# Altium footprint library my Library.PcbLib: 1247 footprints (part 52 of 78)
Each footprint in its own frame and in the unit in brackets; x right, y up, seen from the top. Pads: shape width x height; smd on the part's side, far side on the other; paste and mask are expansions set on the pad; w line width, h text height; cw(c..) or ccw(c..) is an arc to the next point about the centre after c.
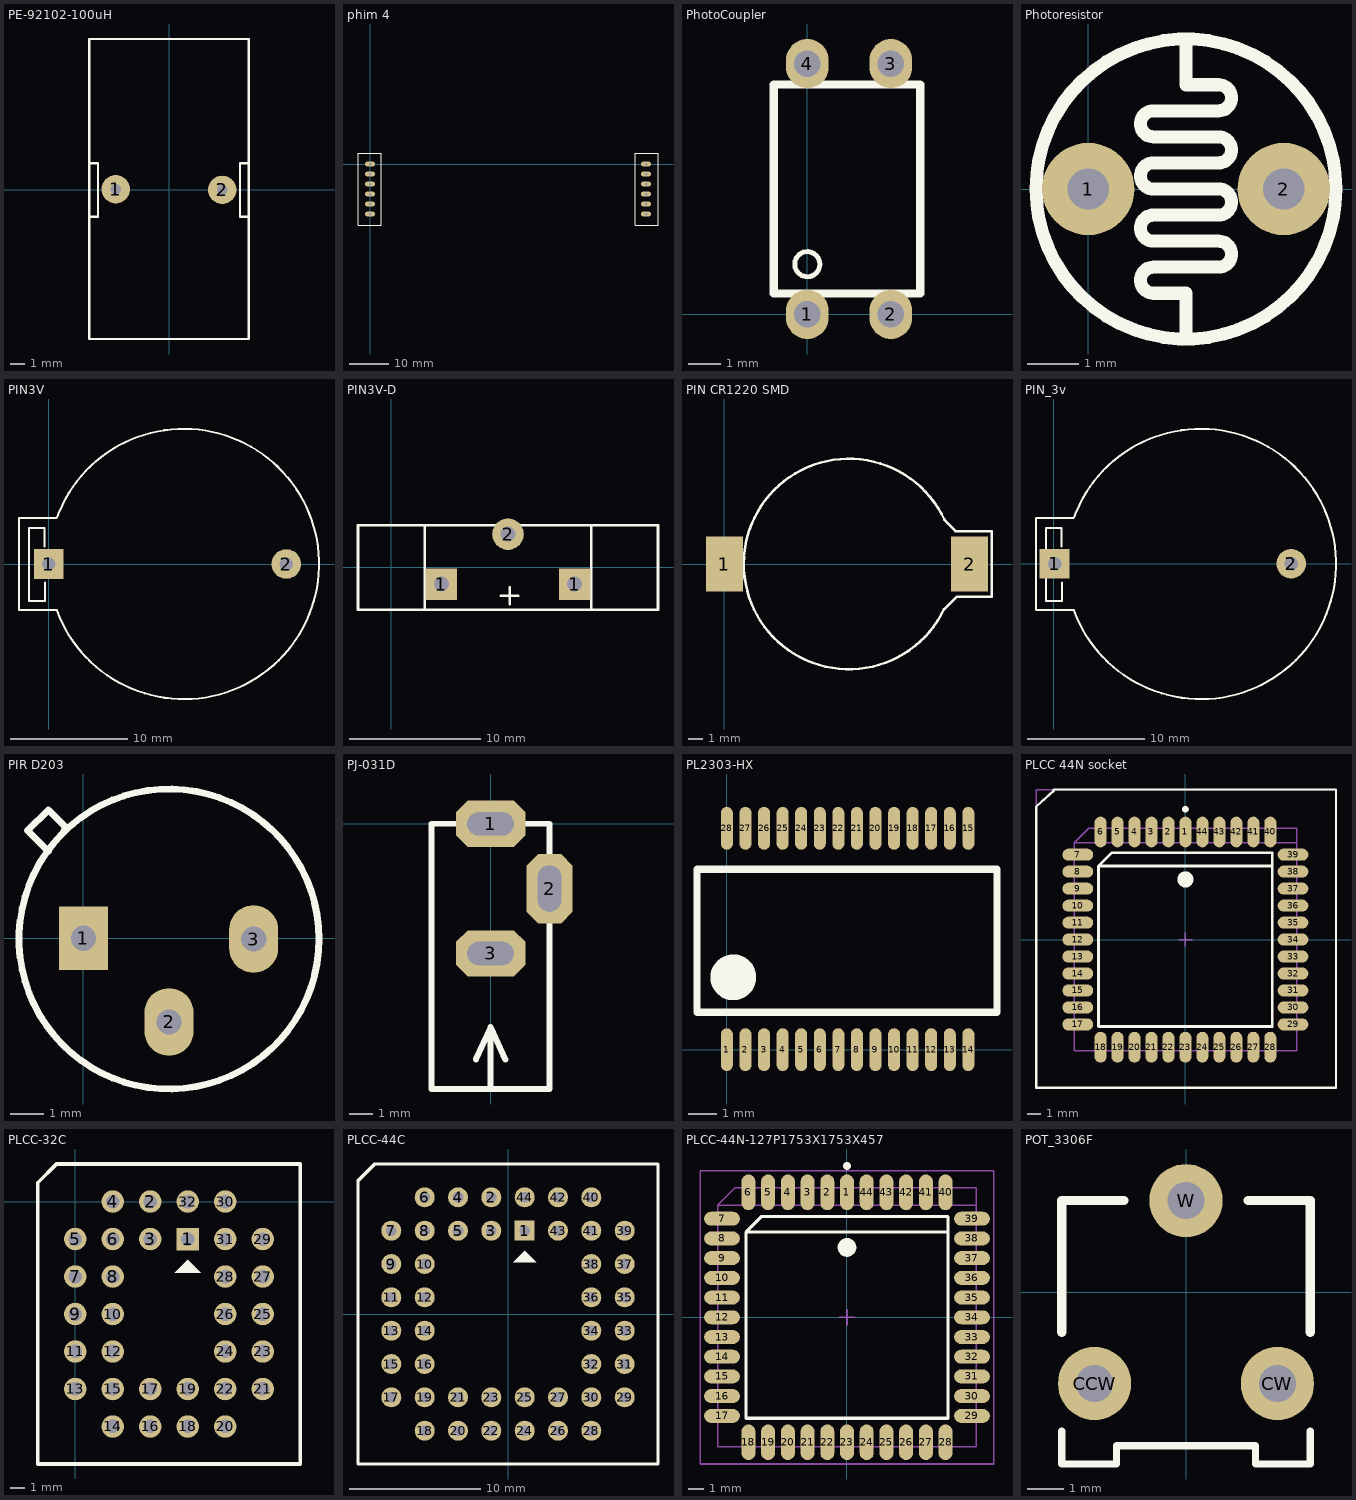
[diagram p51: the footprints below, top view; thin cyan lines are the x and y axes]

## PE-92102-100uH [mil]
pads (2):
  round 80 hole 30: 1(-150,2) 2(150,0)
Top Overlay:
  lines w7: -225,-75 -200,-75 -200,75 -225,75 ; 225,-75 200,-75 200,75 225,75 ; -225,-420 225,-420 225,425 -225,425 -225,-420
3D body "User Library-PE-92102KNL.STEP": height 948.95, standoff -84.84, extent -225,-422.99 225,427

## phim 4 [mil]
pads (12):
  oval 100x50 hole 25: 1(0,0) 2(0,-100) 3(0,-200) 4(0,-300) 5(0,-400) 6(0,-500) 7(2760,-500) 8(2760,-400) 9(2760,-300) 10(2760,-200) 11(2760,-100) 12(2760,0)
Top Overlay:
  lines w10: -120,-610 110,-610 110,110 -120,110 -120,-610 ; 2650,-610 2880,-610 2880,110 2650,110 2650,-610
3D body "User Library-Button-BIG-4.step": height 688.98, standoff 177.17, extent 2137.56,-538.09 2610,8.09
3D body "User Library-Button-BIG-4.step": height 688.98, standoff 177.17, extent 1499.23,-538.09 1971.67,8.09
3D body "User Library-Button-BIG-4.step": height 688.98, standoff 177.17, extent 860.89,-538.09 1333.33,8.09
3D body "User Library-Button-BIG-4.step": height 688.98, standoff 177.17, extent 222.56,-538.09 695,8.09
3D body "female_header_a-bl254-eg-g06d.stp": height 440.94, standoff -19.69, extent 2711.79,-561 2810.21,48.84
3D body "female_header_a-bl254-eg-g06d.stp": height 440.94, standoff -19.69, extent -50,-555.92 48.43,53.92

## PhotoCoupler [mm] "Opto quang"
pads (4):
  oval 1.3x1.5 hole 0.8: 1(0,0) 2(2.54,0) 3(2.54,7.62) 4(0,7.62)
Top Overlay:
  circle w0.15: c0,1.524 r0.381
  lines w0.254: -1.016,0.635 3.429,0.635 3.429,6.985 -1.016,6.985 -1.016,0.635
3D body "SW3DPS-DIP4-DEFAULT.step": height 4.31, standoff -3.28, extent -1.532,-0.19 4.008,7.81

## Photoresistor [mm]
pads (2):
  round 1.8 hole 0.8: 1(0,0) 2(3.81,0)
Top Overlay:
  circle w0.254: c1.905,0 r2.924
  lines w0.254: 1.905,-2.921 1.905,-2.032 1.27,-2.032 cw(c1.27,-1.778) 1.27,-1.524 2.54,-1.524 ccw(c2.54,-1.27) 2.54,-1.016 1.27,-1.016 cw(c1.27,-0.762) 1.27,-0.508 2.54,-0.508 ccw(c2.54,-0.254) 2.54,0 1.27,0 cw(c1.27,0.254) 1.27,0.508 2.54,0.508 ccw(c2.54,0.762) 2.54,1.016 1.27,1.016 cw(c1.27,1.27) 1.27,1.524 2.54,1.524 ccw(c2.54,1.778) 2.54,2.032 1.905,2.032 1.905,2.921

## PIN3V [mil] "Socket PIN 3V"
pads (2):
  rect 100x100 hole 45: 1(0,0)
  round 100 hole 45: 2(800,0)
Top Overlay:
  lines w7: -14,59 -14,121 -66,121 -66,-124 -13,-124 -13,-63 ; 26.33,155 -100,155 -100,-155 27.93,-155 ; 27.6,156.07 cw(c455,0) 27.93,-156.97
3D body "batter2.STEP": height 278.16, standoff -137.2, extent -128.09,-446.83 1001.83,448.83

## PIN3V-D [mil] "Socket PIN 3V-Dung"
pads (3):
  rect 95x95 hole 45: 1(150,-50) 1(550,-50)
  round 95 hole 45: 2(350,100)
Top Overlay:
  lines w8: 100,-127 100,127 ; 329,-85 380,-85 ; 355,-110 355,-60 ; 600,-127 600,127 ; -100,-127 800,-127 800,127 -100,127 -100,-127

## PIN CR1220 SMD [mm] "Socket PIN 3V"
pads (2):
  rect 2.54x3.81 smd: 1(0,0) 2(17,0)
Top Overlay:
  lines w0.178: 15.23,-3.134 cw(c8.636,0) 15.265,3.059 ; 15.24,-3.15 16.104,-2.286 18.542,-2.286 18.542,2.286 16.027,2.286 15.24,3.073
3D body "User Library-Battery Holder for CR1220 SMD.STEP": height 4.03, standoff -0.72, extent -0.764,-7.383 18.036,7.366

## PIN_3v [mil]
pads (2):
  rect 100x100 hole 45: 1(3.54,0)
  round 100 hole 45: 2(800,0)
Top Overlay:
  lines w7: 26.94,57.82 26.94,119.82 -25.06,119.82 -25.06,-125.18 27.94,-125.18 27.94,-64.18 ; 67.27,153.82 -59.06,153.82 -59.06,-156.18 68.88,-156.18 ; 68.55,154.89 cw(c495.94,-1.18) 68.88,-158.15
3D body "User Library-CR2032_HOR_HOLD.STEP": height 335.24, standoff -156.88, extent -35.83,-433.86 928.74,432.28

## PIR D203 [mil]
pads (3):
  rect 58x75 hole 30: 1(0,0)
  oval 58x80 hole 30: 2(101,-99) 3(201,-1)
Top Overlay:
  circle w8: c101,-1 r177.17
  lines w8: -41,103 -42,103 -66,127 -41.5,151.5 -20,130 -23,127
3D body: height 172, standoff 150, extent 52.58,-98.73 198.24,46.22
3D body: height 172, standoff 150, extent -8.94,-36.51 135.31,108.45
3D body: height 171, standoff 150, extent -41.12,-137.27 237.48,140.62
3D body: height 170, standoff 20, extent -60.37,-163.37 258.37,156
3D body: height 40, standoff 20, extent -70,101 -15,156
3D body: height 40, standoff 20, extent -78,-181 280.58,178.29
3D body: height 80, standoff -70, extent 189.05,-12.95 212.95,11
3D body: height 80, standoff -70, extent -11.95,-11.95 11.95,12
3D body: height 80, standoff -70, extent 89.05,-110.95 112.95,-87
3D body: height 20, standoff -40, extent 171.31,-29.74 231,30
3D body: height 20, standoff -40, extent -29.69,-28.74 30,31
3D body: height 20, standoff -40, extent 71.31,-127.74 131,-68

## PJ-031D [mm] "Power Header 1mm"
pads (3):
  oct 3x2 hole 1 slot 2 at 0 deg paste+1: 1(0,0) 3(0,-5.588)
  oct 2x3 hole 1 slot 2 at 90 deg paste+1: 2(2.54,-2.794)
Top Overlay:
  lines w0.254: -0.635,-10.16 0,-8.763 ; 0,-11.43 0,-8.763 ; 0.635,-10.16 0,-8.763 ; -2.54,-11.43 -2.54,0 2.54,0 2.54,-11.43 -2.54,-11.43
3D body "PJ-031D.stp": height 7.4, standoff -3.2, extent -2.5,-11.43 2.9,0.17

## PL2303-HX [mil]
pads (28):
  oval 16.53x59.03 smd mask+7.9: 1(0,0) 2(25.6,0) 3(51.18,0) 4(76.78,0) 5(102.37,0) 6(127.97,0) 7(153.57,0) 8(179.15,0) 9(204.75,0) 10(230.35,0) 11(255.93,0) 12(281.53,0) 13(307.12,0) 14(332.7,0) 15(332.7,305) 16(307.12,305) 17(281.53,305) 18(255.93,305) 19(230.35,305) 20(204.75,305) 21(179.15,305) 22(153.57,305) 23(127.97,305) 24(102.37,305) 25(76.78,305) 26(51.18,305) 27(25.6,305) 28(0,305)
Top Overlay:
  circle w39.37: c8.8,99.7 r11.88
  lines w10: -41.22,51.66 -41.22,248.53 372.21,248.53 372.21,51.66 -41.22,51.66
3D body "SOP65P770x200-28N.step": height 84.65, standoff 0, extent -37.01,0.01 369.69,305.35

## PLCC 44N socket [mm]
pads (44):
  oval 0.9x2.3 smd: 1(0,8.05) 2(-1.27,8.05) 3(-2.54,8.05) 4(-3.81,8.05) 5(-5.08,8.05) 6(-6.35,8.05) 18(-6.35,-8.05) 19(-5.08,-8.05) 20(-3.81,-8.05) 21(-2.54,-8.05) 22(-1.27,-8.05) 23(0,-8.05) 24(1.27,-8.05) 25(2.54,-8.05) 26(3.81,-8.05) 27(5.08,-8.05) 28(6.35,-8.05) 40(6.35,8.05) 41(5.08,8.05) 42(3.81,8.05) 43(2.54,8.05) 44(1.27,8.05)
  oval 2.3x0.9 smd: 7(-8.05,6.35) 8(-8.05,5.08) 9(-8.05,3.81) 10(-8.05,2.54) 11(-8.05,1.27) 12(-8.05,0) 13(-8.05,-1.27) 14(-8.05,-2.54) 15(-8.05,-3.81) 16(-8.05,-5.08) 17(-8.05,-6.35) 29(8.05,-6.35) 30(8.05,-5.08) 31(8.05,-3.81) 32(8.05,-2.54) 33(8.05,-1.27) 34(8.05,0) 35(8.05,1.27) 36(8.05,2.54) 37(8.05,3.81) 38(8.05,5.08) 39(8.05,6.35)
Top Overlay:
  circle w0.25: c0,9.75 r0.125
  circle w0.6: c0,4.5 r0.3
  lines w0.178: -11.175,-11.08 11.265,-11.08 11.265,11.225 -9.84,11.225 -9.84,11.15 -11.175,9.935 -11.175,-11.08
  lines w0.2: 6.5,5.5 -6.5,5.5 ; -6.5,5.5 -5.5,6.5 6.5,6.5 6.5,-6.5 -6.5,-6.5 -6.5,5.5
Mechanical 13:
  lines w0.1: 8.331,7.231 -8.331,7.231 ; -8.331,7.231 -8.331,-8.331 8.331,-8.331 8.331,8.331 -7.231,8.331 -8.331,7.231
Mechanical 15:
  lines w0.1: -0.5,0 0.5,0 ; 0,-0.5 0,0.5 ; -11.18,-11.14 -11.18,11.215 11.245,11.215 11.245,-11.14 -11.18,-11.14
3D body "21744.stp": height 4.62, standoff -1.03, extent -11.165,-11.185 11.255,11.235

## PLCC-32C [mil] "Socket PLCC32R"
height 200
pads (32):
  rect 60x60 hole 36: 1(300,-100)
  round 60 hole 36: 2(200,0) 3(200,-100) 4(100,0) 5(0,-100) 6(100,-100) 7(0,-200) 8(100,-200) 9(0,-300) 10(100,-300) 11(0,-400) 12(100,-400) 13(0,-500) 14(100,-600) 15(100,-500) 16(200,-600) 17(200,-500) 18(300,-600) 19(300,-500) 20(400,-600) 21(500,-500) 22(400,-500) 23(500,-400) 24(400,-400) 25(500,-300) 26(400,-300) 27(500,-200) 28(400,-200) 29(500,-100) 30(400,0) 31(400,-100) 32(300,0)
Top Overlay:
  region: 300,-155 265,-190 335,-190
  lines w10: -100,-700 600,-700 600,100 -50,100 -100,50 -100,-700

## PLCC-44C [mil] "QPC-44C"
height 200
pads (44):
  rect 60x60 hole 32: 1(50,250)
  round 60 hole 32: 2(-50,350) 3(-50,250) 4(-150,350) 5(-150,250) 6(-250,350) 7(-350,250) 8(-250,250) 9(-350,150) 10(-250,150) 11(-350,50) 12(-250,50) 13(-350,-50) 14(-250,-50) 15(-350,-150) 16(-250,-150) 17(-350,-250) 18(-250,-350) 19(-250,-250) 20(-150,-350) 21(-150,-250) 22(-50,-350) 23(-50,-250) 24(50,-350) 25(50,-250) 26(150,-350) 27(150,-250) 28(250,-350) 29(350,-250) 30(250,-250) 31(350,-150) 32(250,-150) 33(350,-50) 34(250,-50) 35(350,50) 36(250,50) 37(350,150) 38(250,150) 39(350,250) 40(250,350) 41(250,250) 42(150,350) 43(150,250) 44(50,350)
Top Overlay:
  region: 50,190 15,155 85,155
  lines w10: -450,-450 450,-450 450,450 -400,450 -450,400 -450,-450

## PLCC-44N-127P1753X1753X457 [mm] "PLCC, 44-Leads, Body 17.7x17.7mm (max), Pitch 1.270mm, IPC Medium Density"
height 4.57
pads (44):
  oval 0.9x2.3 smd: 1(0,8.05) 2(-1.27,8.05) 3(-2.54,8.05) 4(-3.81,8.05) 5(-5.08,8.05) 6(-6.35,8.05) 18(-6.35,-8.05) 19(-5.08,-8.05) 20(-3.81,-8.05) 21(-2.54,-8.05) 22(-1.27,-8.05) 23(0,-8.05) 24(1.27,-8.05) 25(2.54,-8.05) 26(3.81,-8.05) 27(5.08,-8.05) 28(6.35,-8.05) 40(6.35,8.05) 41(5.08,8.05) 42(3.81,8.05) 43(2.54,8.05) 44(1.27,8.05)
  oval 2.3x0.9 smd: 7(-8.05,6.35) 8(-8.05,5.08) 9(-8.05,3.81) 10(-8.05,2.54) 11(-8.05,1.27) 12(-8.05,0) 13(-8.05,-1.27) 14(-8.05,-2.54) 15(-8.05,-3.81) 16(-8.05,-5.08) 17(-8.05,-6.35) 29(8.05,-6.35) 30(8.05,-5.08) 31(8.05,-3.81) 32(8.05,-2.54) 33(8.05,-1.27) 34(8.05,0) 35(8.05,1.27) 36(8.05,2.54) 37(8.05,3.81) 38(8.05,5.08) 39(8.05,6.35)
Top Overlay:
  circle w0.25: c0,9.75 r0.125
  circle w0.6: c0,4.5 r0.3
  lines w0.2: 6.5,5.5 -6.5,5.5 ; -6.5,5.5 -5.5,6.5 6.5,6.5 6.5,-6.5 -6.5,-6.5 -6.5,5.5
Mechanical 13:
  lines w0.1: 8.331,7.231 -8.331,7.231 ; -8.331,7.231 -8.331,-8.331 8.331,-8.331 8.331,8.331 -7.231,8.331 -8.331,7.231
Mechanical 15:
  lines w0.1: -0.5,0 0.5,0 ; 0,-0.5 0,0.5 ; -9.45,-9.45 -9.45,9.45 9.45,9.45 9.45,-9.45 -9.45,-9.45
3D body "User Library-PLCC44.STEP": height 4, standoff -0.6, extent -8.66,-8.66 8.64,8.64

## POT_3306F [mm]
pads (3):
  round 2 hole 1.016: CCW(-2.5,-2.5) CW(2.5,-2.5) W(0,2.5)
Top Overlay:
  lines w0.2: -3.4,-3.8 -3.4,-4.7 -1.9,-4.7 -1.9,-4.2 0,-4.2 1.9,-4.2 1.9,-4.7 3.4,-4.7 3.4,-3.8
  lines w0.254: -3.4,-1.1 -3.4,2.5 -1.7,2.5 ; 1.7,2.5 3.4,2.5 3.4,-1.1
3D body "Trimmer, 3306F.step": height 7.62, standoff -3.04, extent -3.405,-4.876 3.405,3.79